# Altium footprint library lib.PcbLib: 13 footprints
Each footprint in its own frame and in the unit in brackets; x right, y up, seen from the top. Pads: shape width x height; smd on the part's side, far side on the other; paste and mask are expansions set on the pad; w line width, h text height; cw(c..) or ccw(c..) is an arc to the next point about the centre after c.
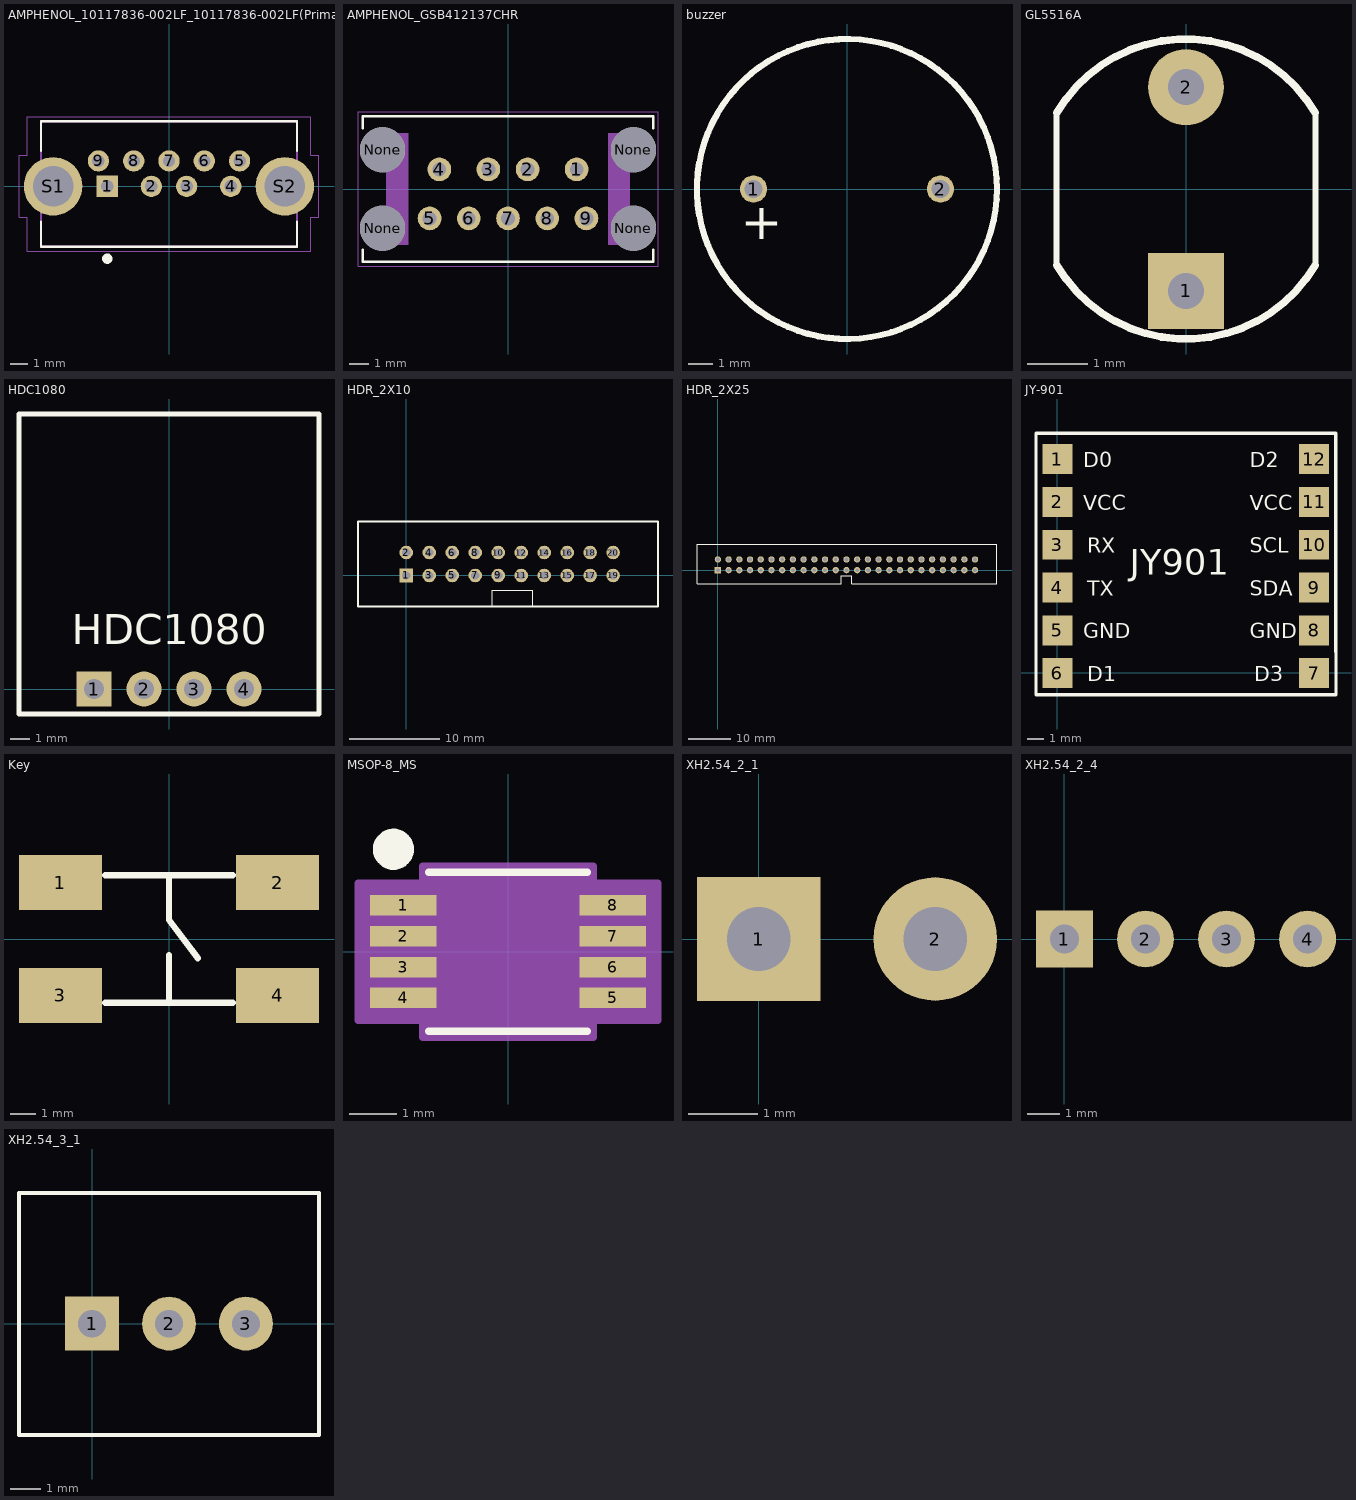
[diagram p0: the footprints below, top view; thin cyan lines are the x and y axes]

## AMPHENOL_10117836-002LF_10117836-002LF(Primary) [mm]
pads (11):
  rect 1.208x1.208 hole 0.7: 1(-3.5,0)
  round 1.208 hole 0.7: 2(-1,0) 3(1,0) 4(3.5,0) 5(4,1.44) 6(2,1.44) 7(0,1.44) 8(-2,1.44) 9(-4,1.44)
  round 3.316 hole 2.3: S1(-6.57,0) S2(6.57,0)
Top Overlay:
  circle w0.3: c-3.5,-4.1 r0.141
  lines w0.127: -7.25,-2 -7.25,-3.43 7.25,-3.43 7.25,-2 ; -7.25,2 -7.25,3.69 7.25,3.69 7.25,2
Mechanical 1:
  lines w0.127: -7.25,-3.43 7.25,-3.43 7.25,3.69 -7.25,3.69 -7.25,-3.43
Mechanical 4:
  lines w0.05: -8.5,-1.75 -8.025,-1.75 -8.025,-3.68 8.025,-3.68 8.025,-1.75 8.5,-1.75 8.5,1.75 8.025,1.75 8.025,3.94 -8.025,3.94 -8.025,1.75 -8.5,1.75 -8.5,-1.75
3D body "10117836.stp": height 14.8, standoff -4, extent -7.707,-3.423 7.961,3.697

## AMPHENOL_GSB412137CHR [mm]
pads (13):
  round 1.208 hole 0.7: 1(3.5,1) 2(1,1) 3(-1,1) 4(-3.5,1) 5(-4,-1.5) 6(-2,-1.5) 7(0,-1.5) 8(2,-1.5) 9(4,-1.5)
  round 2.3 hole 2.3 unplated: None(-6.4,-2) None(-6.4,2) None(6.4,-2) None(6.4,2)
Top Overlay:
  lines w0.127: -7.4,-3.1 -7.4,-3.7 7.4,-3.7 7.4,-3.1 ; -7.4,3.1 -7.4,3.7 7.4,3.7 7.4,3.1
Mechanical 4:
  region: 5.107,2.84 6.2,2.84 6.2,-2.844 5.107,-2.844
  region: -6.209,2.84 -5.1,2.84 -5.1,-2.844 -6.209,-2.844
  lines w0.05: -7.65,-3.95 -7.65,3.95 7.65,3.95 7.65,-3.95 -7.65,-3.95

## buzzer [mm]
pads (2):
  round 1.1 hole 0.75: 1(-3.8,0) 2(3.8,0)
Top Overlay:
  circle w0.254: c0,0 r6.097
  text "+" at -4.318,-2.54 h2.54
3D body: height 10, standoff 0, extent -6.097,-6.097 6.097,6.097

## GL5516A [mm]
pads (2):
  rect 1.27x1.27 hole 0.6: 1(0,-1.7)
  round 1.27 hole 0.6: 2(0,1.7)
Top Overlay:
  lines w0.1: -2.159,-1.27 -2.159,1.27 ; 2.159,-1.27 2.159,1.27
  lines w0.127: -2.159,-1.27 ccw(c0,0) 2.159,-1.27 ; -2.159,1.27 cw(c0,0) 2.159,1.27
3D body: height 2.54, standoff 0, extent -2.16,-2.505 2.16,2.505

## HDC1080 [mil]
pads (4):
  rect 70x70 hole 40.16: 1(-150,0)
  round 70 hole 40.16: 2(-50,0) 3(50,0) 4(150,0)
Top Overlay:
  lines w10: -300,-50 -300,550 300,550 300,-50 -300,-50
  text "HDC1080" at -195,90 h60
3D body "User Library-Header1x2.STEP": height 332.89, standoff -99.4, extent -200,-50 0,50
3D body "User Library-Header1x2.STEP": height 332.89, standoff -99.4, extent 0,-50 200,50
3D body: height 200, standoff 100, extent -300,-50 300,550

## HDR_2X10 [mm] "Connector; Header; 10x2 Position"
height 3.023
pads (20):
  rect 1.5x1.5 hole 0.9: 1(0,0)
  round 1.5 hole 0.9: 2(0,2.54) 3(2.54,0) 4(2.54,2.54) 5(5.08,0) 6(5.08,2.54) 7(7.62,0) 8(7.62,2.54) 9(10.16,0) 10(10.16,2.54) 11(12.7,0) 12(12.7,2.54) 13(15.24,0) 14(15.24,2.54) 15(17.78,0) 16(17.78,2.54) 17(20.32,0) 18(20.32,2.54) 19(22.86,0) 20(22.86,2.54)
Top Overlay:
  lines w0.127: 9.525,-3.429 9.525,-1.651 13.97,-1.651 13.97,-3.429
  lines w0.2: -5.334,-3.429 27.813,-3.429 27.813,5.969 -5.334,5.969 -5.334,-3.429
3D body "c-1761603-27-a1-3d.stp": height 9.22, standoff -2.59, extent -5.207,-3.302 27.813,5.918

## HDR_2X25 [mm] "Connector; Header; 25x2 Position"
height 3.023
pads (50):
  rect 1.5x1.5 hole 0.9: 1(0,0)
  round 1.5 hole 0.9: 2(0,2.54) 3(2.54,0) 4(2.54,2.54) 5(5.08,0) 6(5.08,2.54) 7(7.62,0) 8(7.62,2.54) 9(10.16,0) 10(10.16,2.54) 11(12.7,0) 12(12.7,2.54) 13(15.24,0) 14(15.24,2.54) 15(17.78,0) 16(17.78,2.54) 17(20.32,0) 18(20.32,2.54) 19(22.86,0) 20(22.86,2.54) 21(25.4,0) 22(25.4,2.54) 23(27.94,0) 24(27.94,2.54) 25(30.48,0) 26(30.48,2.54) 27(33.02,0) 28(33.02,2.54) 29(35.56,0) 30(35.56,2.54) 31(38.1,0) 32(38.1,2.54) 33(40.64,0) 34(40.64,2.54) 35(43.18,0) 36(43.18,2.54) 37(45.72,0) 38(45.72,2.54) 39(48.26,0) 40(48.26,2.54) 41(50.8,0) 42(50.8,2.54) 43(53.34,0) 44(53.34,2.54) 45(55.88,0) 46(55.88,2.54) 47(58.42,0) 48(58.42,2.54) 49(60.96,0) 50(60.96,2.54)
Top Overlay:
  lines w0.127: -4.953,-3.175 -4.953,6.096 66.167,6.096 66.167,-3.175 31.75,-3.175 31.75,-1.27 29.21,-1.27 29.21,-3.175 -4.953,-3.175
3D body "c-1761603-35-a1-3d.stp": height 9.22, standoff -2.59, extent -4.953,-3.175 66.167,6.045

## JY-901 [mil]
pads (12):
  rect 70x70 smd: 1(0.63,499.63) 2(0.63,399.63) 3(0.63,299.63) 4(0.63,199.63) 5(0.63,99.63) 6(0.63,-0.37) 7(600.63,-0.37) 8(600.63,99.63) 9(600.63,199.63) 10(600.63,299.63) 11(600.63,399.63) 12(600.63,499.63)
Top Overlay:
  lines w7.87: -49.37,49.63 -49.37,449.63 ; 650.63,449.63 650.63,49.63 651.63,49.63
  lines w8: -49.37,49.63 -49.37,-51.37 651.63,-51.37 651.63,49.63 ; -49.37,449.63 -49.37,560.63 650.63,560.63 650.63,449.63
  text "JY901" at 170,230 h60
  text "VCC" at 60.63,380.63 h35
  text "VCC" at 450.63,380.63 h35
  text "GND" at 60.63,80.63 h35
  text "GND" at 450.63,80.63 h35
  text "RX" at 70.63,280.63 h35
  text "TX" at 70.63,180.63 h35
  text "SDA" at 450.63,180.63 h35
  text "SCL" at 450.63,280.63 h35
  text "D0" at 60.63,480.63 h35
  text "D1" at 70.63,-19.37 h35
  text "D2" at 450.63,480.63 h35
  text "D3" at 460.63,-19.37 h35
3D body: height 78.74, standoff 0, extent 0,-45 600,555

## Key [mm]
pads (4):
  rect 3.3x2.2 smd: 1(-4.325,2.25) 2(4.325,2.25) 3(-4.325,-2.25) 4(4.325,-2.25)
Top Overlay:
  lines w0.254: -2.54,-2.54 2.54,-2.54 ; -2.54,2.54 2.54,2.54 ; 0,-2.54 0,-0.635 ; 0,2.54 0,0.762 1.143,-0.762
3D body "c-1571563-4-s-3d.stp": height 5.08, standoff 0, extent -5,-3 5,3

## MSOP-8_MS [mil]
pads (8):
  rect 55x17 smd: 1(-87,38.39) 2(-87,12.8) 3(-87,-12.8) 4(-87,-38.39) 5(87,-38.39) 6(87,-12.8) 7(87,12.8) 8(87,38.39)
Top Overlay:
  circle w20: c-95,85 r7.07
  lines w6: -66,-66 66,-66 ; -66,66 66,66
Mechanical 13:
  lines w0: -12,61 ccw(c0,61) 12,61
Mechanical 15:
  region: -71,-56.89 -124.5,-56.89 -124.5,56.89 -71,56.89 -71,71 71,71 71,56.89 124.5,56.89 124.5,-56.89 71,-56.89 71,-71 -71,-71
  lines w6: -124.5,-56.89 -124.5,56.89 -71,56.89 -71,71 71,71 71,56.89 124.5,56.89 124.5,-56.89 71,-56.89 71,-71 -71,-71 -71,-56.89 -124.5,-56.89
3D body "MSOP-8_MS.stp": height 43.1, standoff 0, extent -100.5,-61 100.5,61

## XH2.54_2_1 [mil]
pads (2):
  rect 70x70 hole 36: 1(0,0)
  round 70 hole 36: 2(100,0)
3D body "c-2-644861-2-n-3d.stp": height 410, standoff -140, extent -91.99,-141.49 192.01,171.5

## XH2.54_2_4 [mil]
pads (4):
  rect 70x70 hole 36: 1(0,0)
  round 70 hole 36: 2(100,0) 3(200,0) 4(300,0)
3D body "c-2-644861-2-n-3d.stp": height 410, standoff -140, extent -91.99,-141.49 192.01,171.5

## XH2.54_3_1 [mil]
pads (3):
  rect 70x70 hole 36: 1(0,0)
  round 70 hole 36: 2(100,0) 3(200,0)
Top Overlay:
  lines w5: -95,-145 -95,170 295,170 295,-145 -95,-145
3D body "c-2-644861-3-n-3d.stp": height 410, standoff -140, extent -91.99,-141.49 292.01,171.5